# Altium footprint library smdComponent.PcbLib: 182 footprints (part 3 of 12)
Each footprint in its own frame and in the unit in brackets; x right, y up, seen from the top. Pads: shape width x height; smd on the part's side, far side on the other; paste and mask are expansions set on the pad; w line width, h text height; cw(c..) or ccw(c..) is an arc to the next point about the centre after c.
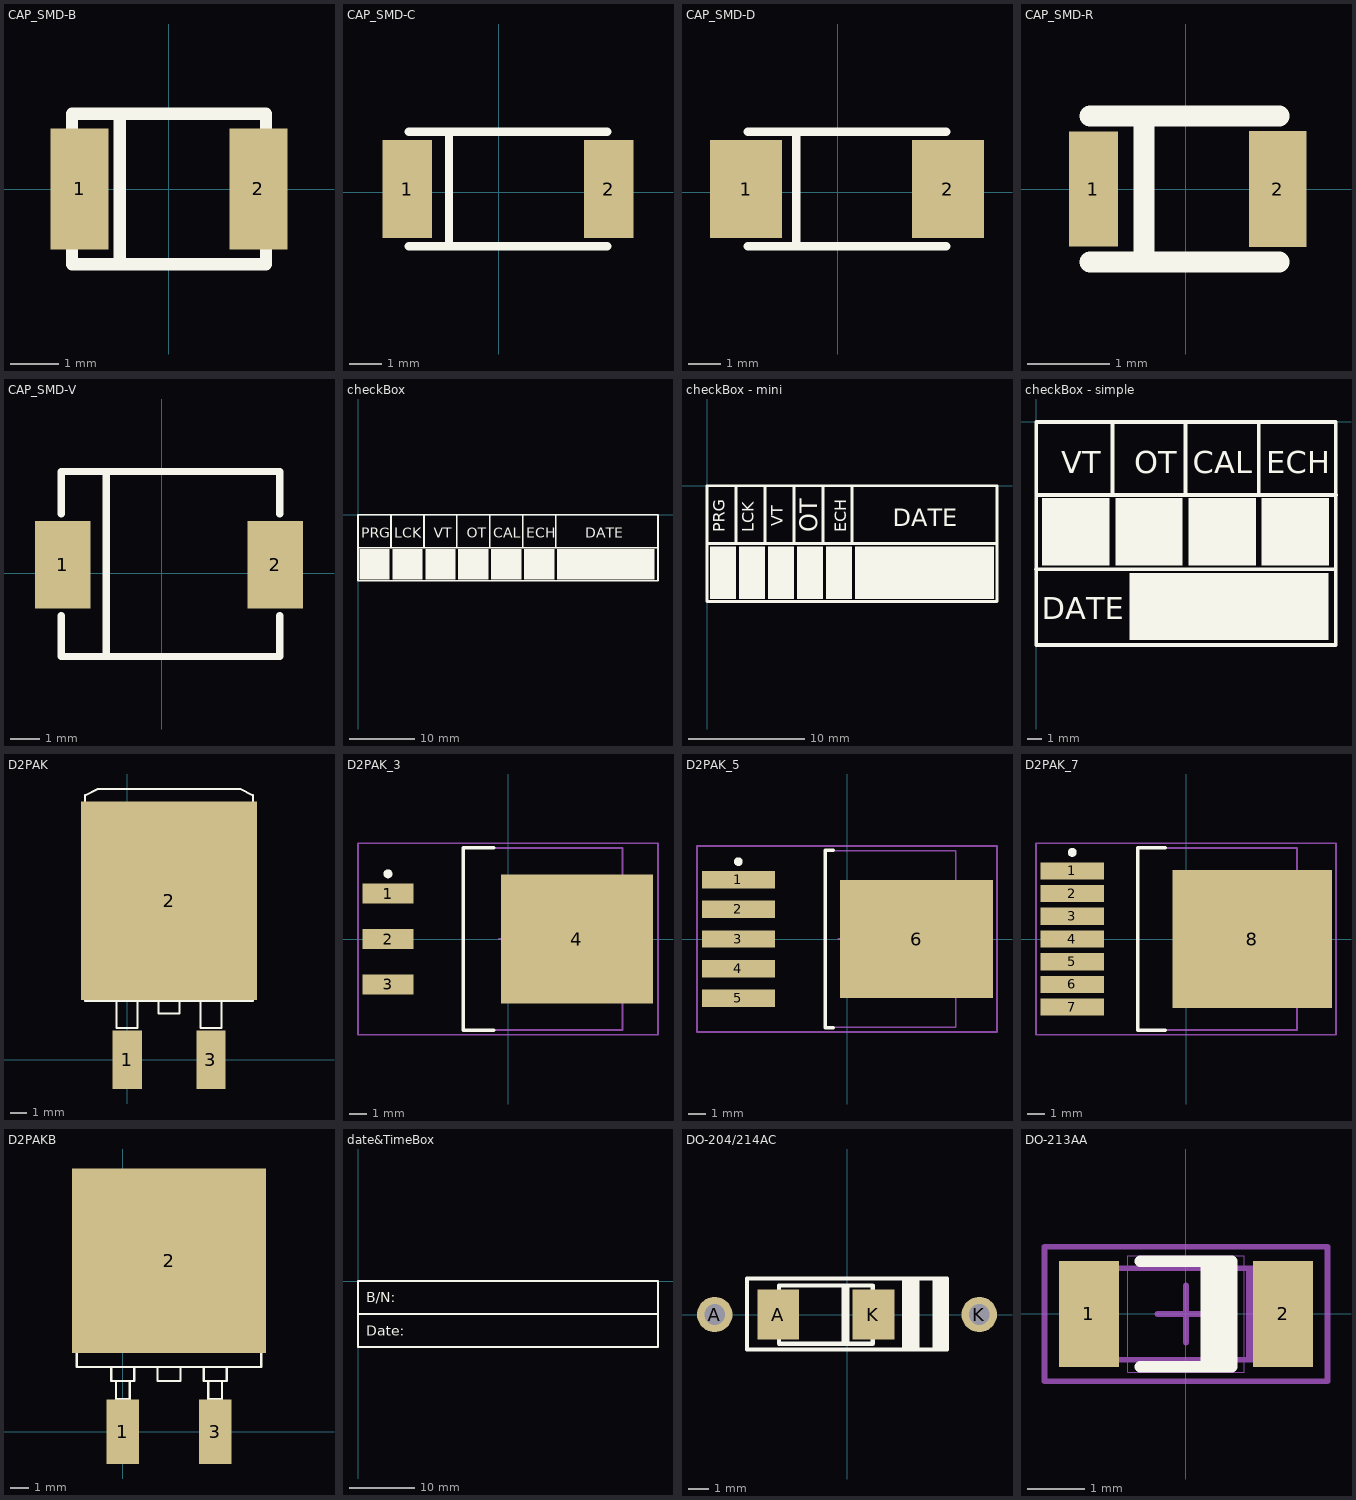
[diagram p2: the footprints below, top view; thin cyan lines are the x and y axes]

## CAP_SMD-B [mm] "3.1X4"
pads (2):
  rect 1.2x2.5 smd: 1(-1.845,0) 2(1.845,0)
Top Overlay:
  lines w0.254: -2,-1.27 -2,-1.55 2,-1.55 2,-1.27 ; -2,1.27 -2,1.55 2,1.55 2,1.27 ; -1.016,-1.55 -1.016,1.524
3D body "Tantalum Capacitor Case B.STEP": height 2.14, standoff 0.04, extent -1.845,-1.41 1.845,1.41

## CAP_SMD-C [mm] "3.5X6"
pads (2):
  rect 1.5x3 smd: 1(-2.8,0.1) 2(3.35,0.1)
Top Overlay:
  lines w0.254: -2.75,-1.65 3.3,-1.65 ; -2.75,1.85 3.3,1.85 ; -1.778,-1.65 -1.524,-1.65 -1.524,1.85
3D body "Tantalum Size C.STEP": height 2.6, standoff 0, extent -2.6,-1.5 3.2,1.7

## CAP_SMD-D [mm] "3.5X6"
pads (2):
  rect 2.2x3 smd: 1(-2.8,0.1) 2(3.35,0.1)
Top Overlay:
  lines w0.254: -2.75,-1.65 3.3,-1.65 ; -2.75,1.85 3.3,1.85 ; -1.27,-1.65 -1.27,1.85
3D body "Tantalum Size C.STEP": height 2.6, standoff 0, extent -2.6,-1.5 3.2,1.7

## CAP_SMD-R [mm] "1.6X2.3"
pads (2):
  rect 0.6x1.4 smd: 1(-1.125,0)
  rect 0.7x1.42 smd: 2(1.125,0)
Top Overlay:
  lines w0.254: -1.165,-0.889 1.143,-0.889 ; -1.165,0.889 1.143,0.889 ; -0.508,-0.889 -0.508,0.889
3D body "Tantalum Capacitor Case R.STEP": height 1.35, standoff 0, extent -1.125,-0.675 1.125,0.675

## CAP_SMD-V [mm] "6.3X7.5"
pads (2):
  rect 1.9x3 smd: 1(-3.4,0.3) 2(3.9,0.3)
Top Overlay:
  lines w0.254: -3.45,-1.45 -3.45,-2.85 -0.037,-2.85 2.987,-2.85 4.05,-2.85 4.05,-1.45 ; -3.45,2.05 -3.45,3.5 4.05,3.5 4.05,2.05 ; -1.905,-2.85 -1.905,3.5
3D body "CT_V.STEP": height 3.45, standoff 0, extent -3.4,-2.75 3.9,3.35

## checkBox [mm]
Top Overlay:
  region: 45,-9.8 45,-5.2 30.2,-5.2 30.2,-9.8
  region: 29.8,-9.8 29.8,-5.2 25.2,-5.2 25.2,-9.8
  region: 24.8,-9.8 24.8,-5.2 20.2,-5.2 20.2,-9.8
  region: 19.8,-9.8 19.8,-5.2 15.2,-5.2 15.2,-9.8
  region: 14.8,-9.8 14.8,-5.2 10.2,-5.2 10.2,-9.8
  region: 9.8,-9.8 9.8,-5.2 5.2,-5.2 5.2,-9.8
  region: 4.8,-9.8 4.8,-5.2 0.2,-5.2 0.2,-9.8
  lines w0.254: 0,-5 45.5,-5 ; 5,-5 5,0 ; 10,-5 10,0 ; 15,-5 15,0 ; 20,-5 20,0 ; 25,-5 25,0 ; 30,-5 30,0 ; 0,-10 45.5,-10 45.5,0 0,0 0,-10
  text "PRG" at 0.5,-3.5 h1.52
  text "LCK" at 5.5,-3.5 h1.52
  text "VT" at 11.5,-3.5 h1.52
  text "CAL" at 20.5,-3.5 h1.52
  text "OT" at 16.5,-3.5 h1.52
  text "ECH" at 25.5,-3.5 h1.52
  text "DATE" at 34.5,-3.5 h1.52

## checkBox - mini [mm]
Top Overlay:
  region: 2.5,-9.75 2.5,-5.25 0.25,-5.25 0.25,-9.75
  region: 5,-9.75 5,-5.25 2.75,-5.25 2.75,-9.75
  region: 7.5,-9.75 7.5,-5.25 5.25,-5.25 5.25,-9.75
  region: 10,-9.75 10,-5.25 7.75,-5.25 7.75,-9.75
  region: 12.5,-9.75 12.5,-5.25 10.25,-5.25 10.25,-9.75
  region: 24.75,-9.75 24.75,-5.25 12.75,-5.25 12.75,-9.75
  lines w0.254: 0,-5 25,-5 ; 2.5,-5 2.5,0 ; 5,-5 5,0 ; 7.5,-5 7.5,0 ; 10,-5 10,0 ; 12.5,-5 12.5,0 ; 0,-10 0,0 25,0 25,-10 0,-10
  text "DATE" at 16,-3.5 h1.52
  text "ECH" at 12,-4 h1.02
  text "VT" at 6.5,-3.5 h1.02
  text "LCK" at 4,-4 h1.02
  text "PRG" at 1.5,-4 h1.02
  text "OT" at 9.5,-4 h1.52

## checkBox - simple [mm]
Top Overlay:
  region: 4.996,-9.8 4.996,-5.2 0.396,-5.2 0.396,-9.8
  region: 9.996,-9.8 9.996,-5.2 5.396,-5.2 5.396,-9.8
  region: 14.996,-9.8 14.996,-5.2 10.396,-5.2 10.396,-9.8
  region: 19.996,-9.8 19.996,-5.2 15.396,-5.2 15.396,-9.8
  region: 19.964,-14.91 19.964,-10.31 6.35,-10.31 6.35,-14.91
  lines w0.254: -0.025,-10.058 20.371,-10.058 ; 0.076,-5 20.472,-5 ; 5.196,-5 5.196,0 ; 10.196,-5 10.196,0 ; 15.196,-5 15.196,0 ; 0,-15.24 20.447,-15.24 20.447,0 0,0 0,-15.24
  text "DATE" at 0.356,-13.487 h1.52
  text "ECH" at 15.696,-3.5 h1.52
  text "OT" at 6.696,-3.5 h1.52
  text "CAL" at 10.696,-3.5 h1.52
  text "VT" at 1.696,-3.5 h1.52

## D2PAK [mil]
pads (3):
  rect 70x140 smd: 1(0,0) 3(200,0)
  rect 420x472.44 smd: 2(99.91,378.74)
Top Overlay:
  lines w5: -25,140 -25,75 25,75 25,140 ; 75,140 75,110 125,110 125,140 ; 175,140 175,75 225,75 225,140 ; -100,140 -90,150 ; -100,140 300,140 ; -100,140 -100,600 ; -100,600 -90,575 ; -100,600 300,600 ; -100,600 -100,630 -70,645 270,645 300,630 300,600 ; -90,150 290,150 ; -90,150 -90,575 ; -90,575 290,575 ; 290,150 300,140 ; 290,150 290,575 ; 290,575 300,600 ; 300,140 300,600
3D body "D2PAK.STEP": height 184.65, standoff -2.52, extent -100,-9.78 300,555.57

## D2PAK_3 [mm] "D2-PAK, 4-Pads, Body 8.9x10.2mm (max), IPC Medium Density"
height 4.5
pads (4):
  rect 2.85x1.1 smd: 1(-6.7,2.54) 2(-6.7,0) 3(-6.7,-2.54)
  rect 8.5x7.2 smd: 4(3.85,0)
Top Overlay:
  circle w0.25: c-6.7,3.64 r0.125
  lines w0.2: -0.8,-5.1 -2.5,-5.1 -2.5,5.1 -0.8,5.1
Mechanical 13:
  lines w0.1: -2.5,-5.075 -2.5,5.075 6.39,5.075 6.39,-5.075 -2.5,-5.075
Mechanical 15:
  lines w0.1: -0.5,0 0.5,0 ; 0,-0.5 0,0.5 ; -8.375,-5.35 -8.375,5.35 8.375,5.35 8.375,-5.35 -8.375,-5.35
3D body "SW3dPS-TO263-3.STEP": height 4.78, standoff -0.02, extent -7.835,-4.996 7.835,5.004

## D2PAK_5 [mm] "D2-PAK, 6-Pads, Body 7.5x10.2mm (max), IPC Medium Density"
height 4.5
pads (6):
  rect 4.2x1 smd: 1(-6.25,3.4) 2(-6.25,1.7) 3(-6.25,0) 4(-6.25,-1.7) 5(-6.25,-3.4)
  rect 8.8x6.8 smd: 6(4,0)
Top Overlay:
  circle w0.25: c-6.25,4.45 r0.125
  lines w0.2: -0.8,-5.1 -1.25,-5.1 -1.25,5.1 -0.8,5.1
Mechanical 13:
  lines w0.1: -1.25,-5.075 6.25,-5.075 6.25,5.075 -1.25,5.075 -1.25,-5.075
Mechanical 15:
  lines w0.1: -0.5,0 0.5,0 ; 0,-0.5 0,0.5 ; -8.625,-5.35 8.625,-5.35 8.625,5.35 -8.625,5.35 -8.625,-5.35
3D body "SW3dPS-TO263-5.STEP": height 4.78, standoff -0.02, extent -7.745,-5.029 7.925,4.971

## D2PAK_7 [mm] "D2-PAK, 7-Pads, Body 8.9x10.2mm (max), IPC Medium Density"
height 4.5
pads (8):
  rect 3.55x0.95 smd: 1(-6.35,3.81) 2(-6.35,2.54) 3(-6.35,1.27) 4(-6.35,0) 5(-6.35,-1.27) 6(-6.35,-2.54) 7(-6.35,-3.81)
  rect 8.9x7.7 smd: 8(3.7,0)
Top Overlay:
  circle w0.25: c-6.35,4.835 r0.125
  lines w0.2: -1.15,-5.1 -2.7,-5.1 -2.7,5.1 -1.15,5.1
Mechanical 13:
  lines w0.1: -2.7,-5.075 -2.7,5.075 6.19,5.075 6.19,-5.075 -2.7,-5.075
Mechanical 15:
  lines w0.1: -0.5,0 0.5,0 ; 0,-0.5 0,0.5 ; -8.375,-5.35 -8.375,5.35 8.375,5.35 8.375,-5.35 -8.375,-5.35
3D body "SW3dPS-TO263-7.STEP": height 4.56, standoff -0.01, extent -7.005,-5.105 7.361,5.055

## D2PAKB [mil]
pads (3):
  rect 70x140 smd: 1(0,0) 3(200,0)
  rect 420x400 smd: 2(100,370)
Top Overlay:
  lines w5: -25,140 -25,110 25,110 25,140 ; -15,110 -15,70 15,70 15,110 ; 75,140 75,110 125,110 125,140 ; 175,140 175,110 225,110 225,140 ; 185,110 185,70 215,70 215,110 ; -100,140 -100,520 -100,550 -70,565 270,565 300,550 300,520 300,140 -100,140

## date&TimeBox [mm]
Top Overlay:
  lines w0.254: 0,-5 45.5,-5 ; 0,-10 45.5,-10 45.5,0 0,0 0,-10
  text "Date:" at 1.245,-8.28 h1.52
  text "B/N:" at 1.245,-3.2 h1.52

## DO-204/214AC [mm]
pads (4):
  round 1.7 hole 1: A(-6.35,0) K(6.35,0)
  rect 2x2.4 smd: A(-3.302,0) K(1.27,0)
Top Overlay:
  rectangle: -0.254,-1.397 0.127,1.397
  region: 2.631,1.753 2.631,-1.626 3.484,-1.626 3.484,1.753
  rectangle: 4.1,-1.676 4.9,1.727
  lines w0.2: 4.8,-1.676 -4.8,-1.676 -4.8,1.727 4.8,1.727
  lines w0.203: -3.266,-1.143 -3.266,-1.397 1.234,-1.397 1.234,-1.143 ; -3.266,1.143 -3.266,1.397 1.234,1.397 1.234,1.143
3D body "DO-15-50.step": height 3.53, standoff -2, extent -6.901,-1.741 6.849,1.747

## DO-213AA [mm] "MELF Diode, 2-Leads, Body 3.5x1.6mm, IPC Medium Density"
height 1.6
pads (2):
  rect 1.05x1.85 smd: 1(-1.7,0) 2(1.7,0)
Top Overlay:
  rectangle: 0.25,-0.925 0.8,0.925
  lines w0.2: -0.8,-0.925 0.8,-0.925 0.8,0.925 -0.8,0.925
Mechanical 10:
  lines w0.01: -1.016,-1.016 1.016,-1.016 1.016,0.254 1.016,1.016 -1.016,1.016 -1.016,-1.016
Mechanical 13:
  rectangle: 1.101,-0.758 1.572,0.842
  lines w0.1: 1.101,-0.758 1.101,0.8 ; 1.549,-0.8 1.549,0.8 ; -1.75,-0.8 -1.75,0.8 1.75,0.8 1.75,-0.8 -1.75,-0.8
Mechanical 15:
  lines w0.1: -0.5,0 0.5,0 ; 0,-0.5 0,0.5 ; -2.475,-1.175 -2.475,1.175 2.475,1.175 2.475,-1.175 -2.475,-1.175
3D body: height 1.6, standoff 0, extent -1.75,-0.8 1.75,0.8
3D body: height 1.61, standoff 0, extent 1.092,-0.8 1.549,0.799